# Altium footprint library Sajad_Altium_Library.PcbLib: 380 footprints (part 6 of 24)
Each footprint in its own frame and in the unit in brackets; x right, y up, seen from the top. Pads: shape width x height; smd on the part's side, far side on the other; paste and mask are expansions set on the pad; w line width, h text height; cw(c..) or ccw(c..) is an arc to the next point about the centre after c.
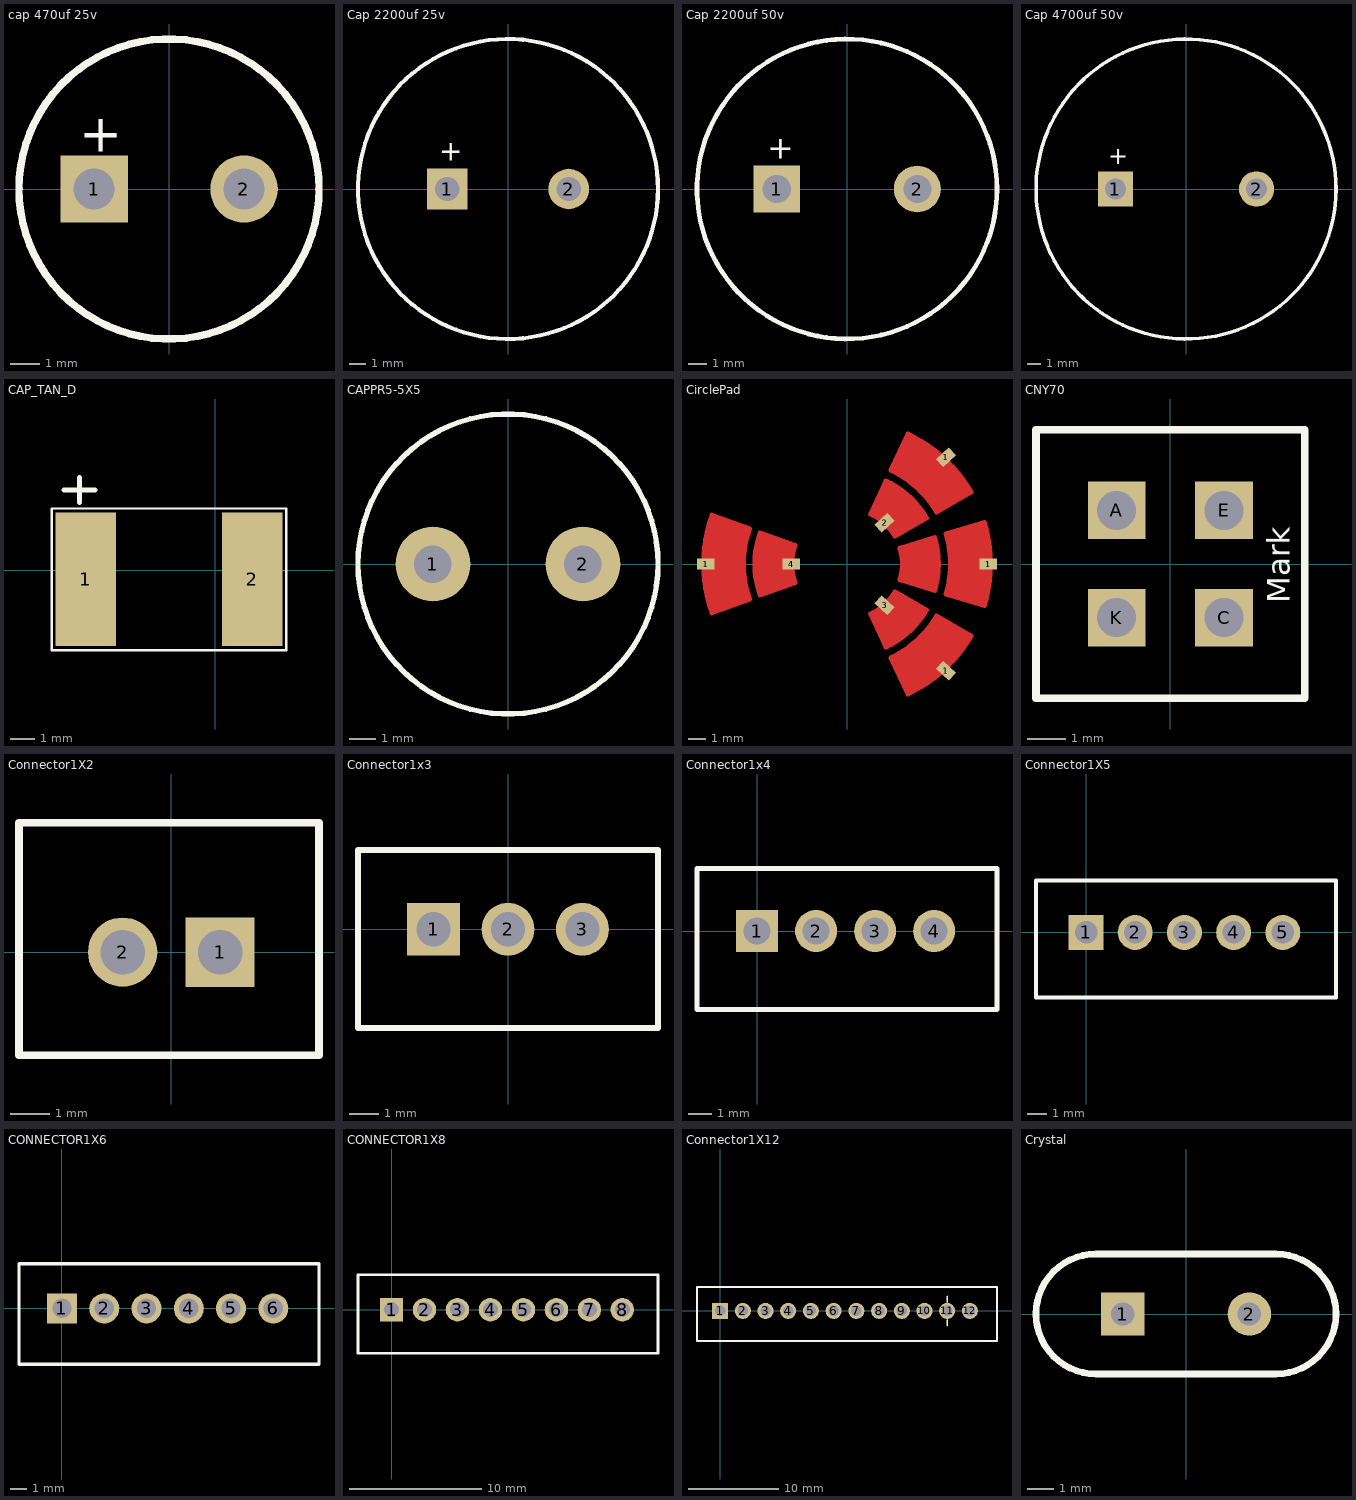
[diagram p5: the footprints below, top view; thin cyan lines are the x and y axes]

## cap 470uf 25v [mil] "cap 470uf 25v"
pads (2):
  rect 90x90 hole 55: 1(-100,0)
  round 90 hole 55: 2(100,0)
Top Overlay:
  circle w10: c0,0 r200
  text "+" at -120,50 h50
3D body: height 634.96, standoff -742.99, extent -196.85,-196.85 196.85,196.85

## Cap 2200uf 25v [mil] "Cap 2200uf 25v"
pads (2):
  rect 100x100 hole 60: 1(-150,0)
  round 100 hole 60: 2(150,0)
Top Overlay:
  circle w10: c0,0 r370
  text "+" at -170,70 h50
3D body: height 629.92, standoff 0, extent -370.27,-370.27 370.27,370.27

## Cap 2200uf 50v [mil] "Cap 2200uf 50v"
pads (2):
  rect 100x100 hole 60: 1(-150,0)
  round 100 hole 60: 2(150,0)
Top Overlay:
  circle w10: c0,0 r320
  text "+" at -170,65 h50
3D body: height 992.13, standoff -740.16, extent -314.97,-314.96 314.95,314.97

## Cap 4700uf 50v [mil] "Cap 4700uf 50v"
pads (2):
  rect 100x100 hole 60: 1(-200,0)
  round 100 hole 60: 2(200,0)
Top Overlay:
  circle w10: c0,0 r425
  text "+" at -220,70 h50

## CAP_TAN_D [mm]
pads (2):
  rect 2.5x5.5 smd: 1(-5.334,-0.381) 2(1.524,-0.381)
Top Overlay:
  lines w0.1: -6.731,-3.302 2.921,-3.302 2.921,2.54 -6.731,2.54 -6.731,-3.302
  lines w0.2: -6.223,3.302 -4.953,3.302 ; -5.588,2.794 -5.588,3.81

## CAPPR5-5X5 [mil] "Capacitor, Electrolytic, Radial; Body 5 x 5 mm (Dia.xH typ); Pin Spacing 5 mm (typ)"
pads (2):
  round 110 hole 55: 1(-110,0) 2(110,0)
Top Overlay:
  lines w7.87: -220,0 ccw(c0,0) 220,0 ccw(c0,0) -220,0
3D body: height 477.56, standoff -152.36, extent -196.85,-195 196.85,198.7

## CirclePad [mil]
pads (14):
  rect 40x25 smd: 1(-323,0) 1(323,0) 4(-128,0)
  rect 40x25 on Top Solder: 1(-323,0) 1(323,0) 4(-128,0)
  rect 25x40 smd rot 47.5: 1(226,-244) 3(86,-94)
  rect 25x40 on Top Solder rot 47.5: 1(226,-244) 3(86,-94)
  rect 25x40 smd rot 132.5: 1(226,244) 2(86,94)
  rect 25x40 on Top Solder rot 132.5: 1(226,244) 2(86,94)
Top Layer:
  region: -198.92,72.05 -208,35 -210,-6 -202,-55 -198.93,-72.04 -118.39,-43.09 -130,-6 -118.39,43.09
  region: -221.97,80.79 -238,17 -232,-49 -221.97,-80.79 -308.91,-112.44 -326,-28 -321,66 -308.91,112.44
  region: 53.24,-114.18 89.02,-190.9 147,-152 182.41,-105.31 109.11,-62.99 86,-93
  region: 99.83,-214.09 138.93,-297.94 196,-262 256,-203 284,-163.97 204.57,-118.11 161,-177
  region: 225.9,69.06 237,8 225.9,-69.06 314.38,-96.11 328,-21 320,73 314.38,96.11 306,93.55
  region: 138.93,297.94 201,259 263,195 284.7,164.37 204.57,118.11 169,170 99.83,214.09
  region: 89.02,190.9 147,150 181.87,105 109.11,62.99 74,102 53.24,114.18
  region: 123,35 128,0 120.48,-36.83 200.43,-61.57 208,-1 200.43,61.57
  lines w10: -198.93,-72.04 cw(c-1,0) -198.93,72.04 ; -198.92,-72.05 -118.39,-43.09 cw(c0,0) -118.39,43.09 -198.92,72.05 ; 200.43,-61.58 ccw(c-1,0) 200.43,61.58 ; 200.43,-61.57 120.48,-36.83 ccw(c0,0) 120.48,36.83 200.43,61.57 ; -308.91,-112.44 cw(c0,0) -308.91,112.44 -221.97,80.79 ccw(c0,0) -221.97,-80.79 -308.91,-112.44 ; 53.24,-114.18 ccw(c0,0) 109.11,-62.99 182.41,-105.31 cw(c0,0) 89.02,-190.9 53.24,-114.18 ; 53.24,114.18 cw(c0,0) 109.11,62.99 182.41,105.31 ccw(c0,0) 89.02,190.9 53.24,114.18 ; 99.83,-214.09 ccw(c0,0) 204.57,-118.11 284.7,-164.37 cw(c0,0) 138.93,-297.94 99.83,-214.09 ; 99.83,214.09 cw(c0,0) 204.57,118.11 284.7,164.37 ccw(c0,0) 138.93,297.94 99.83,214.09 ; 225.9,-69.06 ccw(c0,0) 225.9,69.06 314.38,96.11 cw(c0,0) 314.38,-96.11 225.9,-69.06
Top Solder:
  region: 123,35 128,0 120.48,-36.83 200.43,-61.57 208,-1 200.43,61.57
  region: 89.02,190.9 147,150 181.87,105 109.11,62.99 74,102 53.24,114.18
  region: 138.93,297.94 201,259 263,195 284.7,164.37 204.57,118.11 169,170 99.83,214.09
  region: 225.9,69.06 237,8 225.9,-69.06 314.38,-96.11 328,-21 320,73 314.38,96.11 306,93.55
  region: 99.83,-214.09 138.93,-297.94 196,-262 256,-203 284,-163.97 204.57,-118.11 161,-177
  region: 53.24,-114.18 89.02,-190.9 147,-152 182.41,-105.31 109.11,-62.99 86,-93
  region: -221.97,80.79 -238,17 -232,-49 -221.97,-80.79 -308.91,-112.44 -326,-28 -321,66 -308.91,112.44
  region: -198.92,72.05 -208,35 -210,-6 -202,-55 -198.93,-72.04 -118.39,-43.09 -130,-6 -118.39,43.09
  lines w10: -198.93,-72.04 cw(c-1,0) -198.93,72.04 ; -198.92,-72.05 -118.39,-43.09 cw(c0,0) -118.39,43.09 -198.92,72.05 ; 200.43,-61.58 ccw(c-1,0) 200.43,61.58 ; 200.43,-61.57 120.48,-36.83 ccw(c0,0) 120.48,36.83 200.43,61.57 ; -308.91,-112.44 cw(c0,0) -308.91,112.44 -221.97,80.79 ccw(c0,0) -221.97,-80.79 -308.91,-112.44 ; 53.24,-114.18 ccw(c0,0) 109.11,-62.99 182.41,-105.31 cw(c0,0) 89.02,-190.9 53.24,-114.18 ; 53.24,114.18 cw(c0,0) 109.11,62.99 182.41,105.31 ccw(c0,0) 89.02,190.9 53.24,114.18 ; 99.83,-214.09 ccw(c0,0) 204.57,-118.11 284.7,-164.37 cw(c0,0) 138.93,-297.94 99.83,-214.09 ; 99.83,214.09 cw(c0,0) 204.57,118.11 284.7,164.37 ccw(c0,0) 138.93,297.94 99.83,214.09 ; 225.9,-69.06 ccw(c0,0) 225.9,69.06 314.38,96.11 cw(c0,0) 314.38,-96.11 225.9,-69.06

## CNY70 [mm]
height 5.6
pads (4):
  rect 1.5x1.5 hole 1.016: A(-1.4,1.4) C(1.4,-1.4) E(1.4,1.4) K(-1.4,-1.4)
Top Overlay:
  lines w0.2: -3.5,-3.5 -3.5,3.5 3.5,3.5 3.5,-3.5 -3.5,-3.5
  text "Mark" at 3.302,-1.024 h1.02

## Connector1X2 [mil] "Connector;  2.5 mm"
pads (2):
  rect 70x70 hole 45: 1(49.21,0)
  round 70 hole 45: 2(-49.21,0)
Top Overlay:
  lines w7.87: -153.94,-104.2 -153.94,130.8 149.21,130.8 149.21,-104.2 -153.94,-104.2
3D body: height 338.01, standoff -94.27, extent -100,-50 100,50

## Connector1x3 [mil] "Connector; Header; 3 Position"
pads (3):
  rect 70x70 hole 45: 1(-98.43,0)
  round 70 hole 45: 2(0,0) 3(98.43,0)
Top Overlay:
  lines w7.87: -198.43,-130.8 -198.43,105 198.43,105 198.43,-130.8 -198.43,-130.8
3D body: height 275.59, standoff -133.86, extent -242.52,-128.19 245.67,98.19

## Connector1x4 [mil] "Connector; Header; 4 Position"
pads (4):
  rect 70x70 hole 45: 1(0,0)
  round 70 hole 45: 2(98.43,0) 3(196.85,0) 4(295.28,0)
Top Overlay:
  lines w7.87: -100,-130.8 -100,104.2 400,104.2 400,-130.8 -100,-130.8
3D body: height 275.59, standoff -133.86, extent -94.1,-133.19 394.1,93.19

## Connector1X5 [mil] "Connector; Header; 5 Position"
pads (5):
  rect 70x70 hole 45: 1(0,0)
  round 70 hole 45: 2(98.43,0) 3(196.85,0) 4(295.28,0) 5(393.7,0)
Top Overlay:
  lines w7.87: -100,-130.3 500,-130.3 500,104.2 -100,104.2 -100,-130.3
3D body: height 275.59, standoff -133.86, extent -93.3,-133.19 493.31,93.19

## CONNECTOR1X6 [mil] "Connector; Header; 6 Position"
pads (6):
  rect 70x70 hole 45: 1(0,0)
  round 70 hole 45: 2(98.43,0) 3(196.85,0) 4(295.28,0) 5(393.7,0) 6(492.13,0)
Top Overlay:
  lines w7.87: -100,-130.3 -100,104.2 598.43,104.2 598.43,-130.3 -100,-130.3
3D body: height 275.59, standoff -133.86, extent -44.09,-133.19 542.52,93.19

## CONNECTOR1X8 [mil] "Connector; Header; 8 Position"
pads (8):
  rect 70x70 hole 45: 1(0,0)
  round 70 hole 45: 2(98.43,0) 3(196.85,0) 4(295.28,0) 5(393.7,0) 6(492.13,0) 7(590.55,0) 8(688.98,0)
Top Overlay:
  lines w7.87: 795,-130.3 -100,-130.3 -100,104.2 795,104.2 ; 795.28,-130.3 795.28,104.2
3D body: height 275.59, standoff -133.86, extent -44.09,-133.19 542.52,93.19

## Connector1X12 [mil] "Connector 1x12"
pads (12):
  rect 70x70 hole 45: 1(0,0)
  round 70 hole 45: 2(98.43,0) 3(196.85,0) 4(295.28,0) 5(393.7,0) 6(492.13,0) 7(590.55,0) 8(688.98,0) 9(787.4,0) 10(885.83,0) 11(984.25,0) 12(1082.68,0)
Top Overlay:
  lines w7.87: 984.25,-63.7 984.25,-38.7 ; 984.25,38.7 984.25,63.7 ; -100,-130.3 1200,-130.3 1200,103.7 -100,103.7 -100,-130.3
3D body: height 120.08, standoff -253.94, extent -95.59,-361.38 1180,91.38

## Crystal [mil] "16 Mhz Crystal footprint"
pads (2):
  rect 65x65 hole 35: 1(-95,0)
  round 65 hole 35: 2(95,0)
Top Overlay:
  lines w10: -225,0 cw(c-135,0) -135,90 0,90 135,90 cw(c135,0) 225,0 cw(c135,0) 135,-90 0,-90 -135,-90 cw(c-135,0) -225,0
3D body: height 142.73, standoff -77.74, extent -219.93,-88.96 219.93,95